# Altium footprint library 04.连接器件.pcb.PCBLIB: 363 footprints (part 3 of 23)
Each footprint in its own frame and in the unit in brackets; x right, y up, seen from the top. Pads: shape width x height; smd on the part's side, far side on the other; paste and mask are expansions set on the pad; w line width, h text height; cw(c..) or ccw(c..) is an arc to the next point about the centre after c.
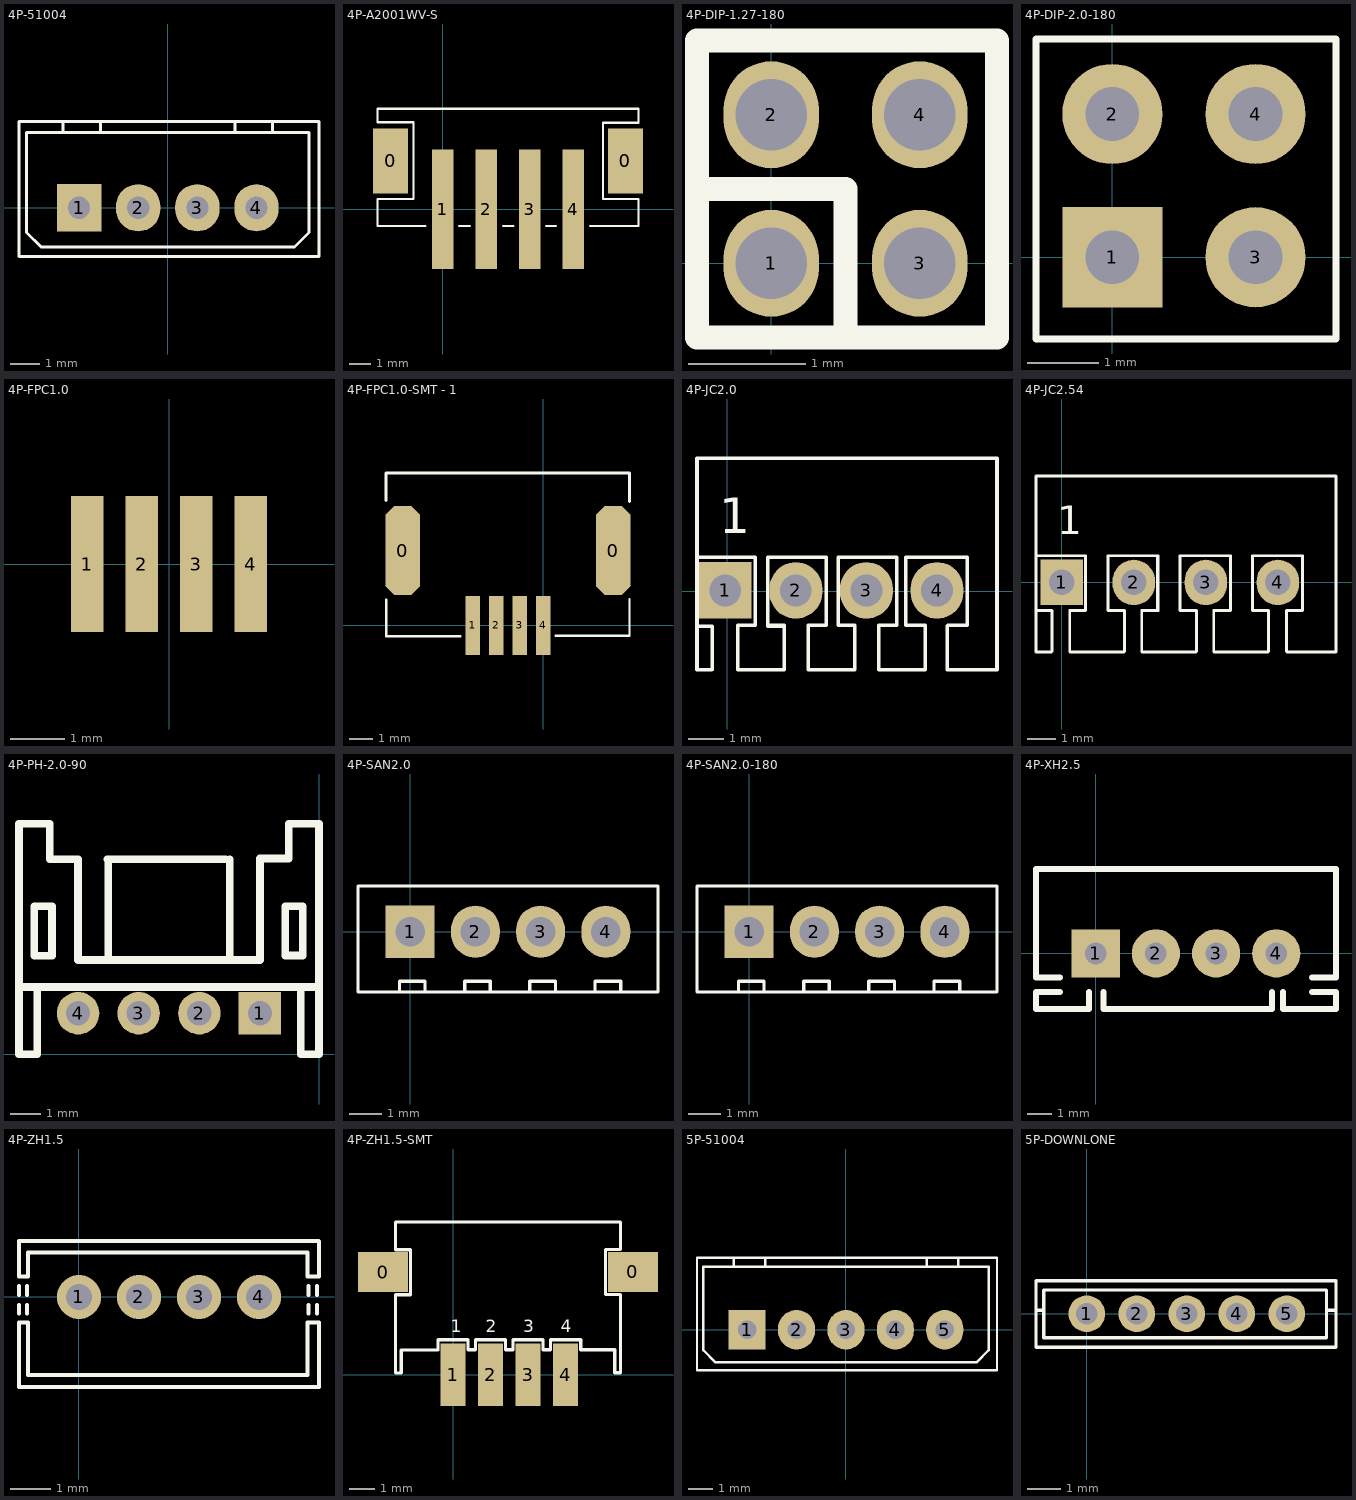
[diagram p2: the footprints below, top view; thin cyan lines are the x and y axes]

## 4P-51004 [mm]
pads (4):
  rect 1.5x1.6 hole 0.75: 1(-3,0)
  oval 1.5x1.6 hole 0.75: 2(-1,0) 3(1,0) 4(3,0)
TopOverlay:
  lines w0.1: -3.54,2.54 -3.54,2.921 ; -2.27,2.54 -2.27,2.921 ; 2.27,2.54 2.27,2.921 ; 3.54,2.54 3.54,2.921 ; -5.032,-1.651 -5.032,2.921 5.115,2.921 5.115,-1.651 -5.032,-1.651 ; -4.774,-0.833 -4.282,-1.325 4.282,-1.325 4.774,-0.833 4.774,2.54 -4.774,2.54 -4.774,-0.833
3D body "510004-4.STEP": height 5.9, standoff -3.47, extent -4.933,-1.549 5.067,2.851

## 4P-A2001WV-S [mm]
pads (6):
  rect 1.6x3 smd: 0(-2.4,2.235) 0(8.4,2.235)
  rect 1x5.5 smd: 1(0,0) 2(2,0) 3(4,0) 4(6,0)
TopOverlay:
  lines w0.1: -0.81,-0.769 -3,-0.769 -3,0.483 -1.346,0.483 -1.346,4.013 -3,4.013 -3,4.631 9,4.631 9,3.988 7.366,3.988 7.366,0.483 9,0.483 9,-0.769 6.785,-0.769 ; 0.739,-0.769 1.247,-0.769 ; 2.771,-0.769 3.254,-0.769 ; 4.753,-0.769 5.21,-0.769
3D body "A2001WV-4.STEP": height 5.9, standoff -0.25, extent -2.974,-2.765 9.026,4.665

## 4P-DIP-1.27-180 [mil]
pads (4):
  oval 32x36 hole 24: 1(0,0) 2(0,50) 3(50,0) 4(50,50)
TopOverlay:
  lines w8: -25,25 25,25 25,-25 ; -25,-25 -25,75 76,75 76,-25 -25,-25

## 4P-DIP-2.0-180 [mm] "插针"
pads (4):
  rect 1.4x1.4 hole 0.75: 1(0,0)
  round 1.4 hole 0.75: 2(0,2) 3(2,0) 4(2,2)
TopOverlay:
  lines w0.1: -1.067,-1.143 -1.067,3.048 3.124,3.048 3.124,-1.143 -1.067,-1.143
3D body "DIP4(2.0)排针.": height 8, standoff -2.6, extent -0.991,-1.041 3.009,2.959

## 4P-FPC1.0 [mm]
pads (4):
  rect 0.6x2.5 smd: 1(-1.5,0) 2(-0.5,0) 3(0.5,0) 4(1.5,0)
3D body: height 1.2, standoff 0, extent 1.295,1.027 1.698,1.11
3D body: height 1.2, standoff 0, extent 0.295,1.027 0.698,1.11
3D body: height 1.2, standoff 0, extent -0.704,1.028 -0.302,1.111
3D body: height 1.2, standoff 0, extent -1.704,1.028 -1.302,1.111

## 4P-FPC1.0-SMT - 1 [mm]
height 2.7
pads (6):
  oct 1.47x3.8 smd: 0(-5.985,3.186) 0(2.985,3.186)
  rect 0.6x2.5 smd: 1(-3,0) 2(-2,0) 3(-1,0) 4(0,0)
TopOverlay:
  lines w0.1: -6.687,1.103 -6.687,-0.457 -3.537,-0.457 ; 0.522,-0.439 3.671,-0.439 3.671,1.11
  lines w0.127: -6.687,5.319 -6.687,6.481 3.675,6.481 3.675,5.283
3D body: height 2.1, standoff 0, extent 1.851,5.302 3.407,6.481
3D body: height 2.1, standoff 0, extent -6.366,5.302 -4.81,6.481
3D body: height 1.2, standoff 0, extent -0.205,1.027 0.198,1.11
3D body: height 1.2, standoff 0, extent -1.205,1.027 -0.802,1.11
3D body: height 1.2, standoff 0, extent -2.204,1.028 -1.802,1.111
3D body: height 1.2, standoff 0, extent -3.204,1.028 -2.802,1.111
3D body: height 0.2, standoff 0, extent -0.205,-0.45 0.198,1.111
3D body: height 0.2, standoff 0, extent -1.205,-0.45 -0.802,1.111
3D body: height 0.2, standoff 0, extent -2.205,-0.45 -1.802,1.111
3D body: height 0.2, standoff 0, extent -3.205,-0.45 -2.802,1.111
3D body: height 2, standoff 0, extent -5.985,1.11 2.985,6.481

## 4P-JC2.0 [mm]
pads (4):
  rect 1.5x1.6 hole 0.9: 1(-0.056,0.025)
  oval 1.5x1.6 hole 0.9: 2(1.944,0.025) 3(3.944,0.025) 4(5.944,0.025)
TopOverlay:
  lines w0.1: -0.856,-0.991 -0.419,-0.991 -0.419,-2.21 -0.433,-2.225 -0.856,-2.225 -0.856,0.965 ; 1.144,-0.991 1.581,-0.991 ; 3.567,-2.225 3.581,-2.21 ; 6.233,-0.98 6.233,-2.225 7.644,-2.225 7.644,3.775 -0.856,3.775 -0.856,0.965 ; 6.248,-0.965 6.807,-0.965 6.807,0.965 5.055,0.965 5.055,-0.965 5.613,-0.965 5.613,-2.225 4.293,-2.225 4.293,-0.965 4.801,-0.965 4.801,0.965 3.144,0.965 3.144,-0.965 3.613,-0.965 3.613,-2.225 2.293,-2.225 2.293,-0.965 2.801,-0.965 2.801,0.965 1.144,0.965 1.144,-0.965 1.613,-0.965 1.613,-2.225 0.293,-2.225 0.293,-0.965 0.801,-0.965 0.801,0.965 -0.856,0.965 ; 1.567,-2.225 1.581,-2.21 1.567,-2.225
  text "1" at -0.229,1.651 h1
3D body "4P-JC2.0.STEP": height 3.4, standoff -3.22, extent -1.321,-7.163 7.179,3.837

## 4P-JC2.54 [mm]
pads (4):
  rect 1.5x1.6 hole 0.9: 1(0,0)
  oval 1.5x1.6 hole 0.9: 2(2.54,0) 3(5.08,0) 4(7.62,0)
TopOverlay:
  lines w0.1: -0.91,-0.991 -0.351,-0.991 -0.351,-2.436 -0.365,-2.45 -0.91,-2.45 -0.91,0.94 ; 0.838,0.935 0.838,-0.991 0.279,-0.991 0.279,-2.436 0.293,-2.45 0.838,-2.45 1.651,-2.45 2.196,-2.45 2.21,-2.436 2.21,-0.991 1.651,-0.991 ; 0.843,0.94 -0.91,0.94 ; 2.189,-0.991 1.63,-0.991 1.63,0.94 ; 2.845,-2.436 2.859,-2.45 ; 3.378,0.935 3.378,-0.991 ; 3.404,-0.991 3.404,0.94 ; 4.17,-2.45 4.715,-2.45 4.729,-2.436 ; 4.191,-0.991 4.75,-0.991 4.75,-2.436 4.736,-2.45 4.191,-2.45 3.378,-2.45 ; 4.729,-0.991 4.17,-0.991 4.17,0.94 5.923,0.94 ; 5.385,-2.436 5.399,-2.45 ; 5.918,-0.991 5.359,-0.991 5.359,-2.436 5.373,-2.45 5.918,-2.45 6.731,-2.45 7.276,-2.45 7.29,-2.436 7.29,-0.991 6.731,-0.991 6.731,0.94 8.484,0.94 8.484,-0.991 7.925,-0.991 7.925,-2.436 7.939,-2.45 8.484,-2.45 9.67,-2.45 9.67,3.75 -0.91,3.75 -0.91,0.94 ; 5.944,-0.991 5.944,0.94 ; 1.63,0.94 3.383,0.94 1.63,0.94 ; 2.819,-2.436 2.819,-0.991 ; 2.819,-2.436 2.833,-2.45 ; 2.819,-2.436 2.819,-0.991 ; 2.819,-2.436 2.833,-2.45 ; 2.819,-0.991 3.378,-0.991 ; 2.819,-0.991 3.378,-0.991 ; 2.833,-2.45 3.378,-2.45 ; 2.833,-2.45 3.378,-2.45 ; 2.175,-2.45 2.189,-2.436 2.175,-2.45
  text "1" at -0.152,1.702 h1

## 4P-PH-2.0-90 [mm]
pads (4):
  rect 1.4x1.4 hole 0.8: 1(-1.95,1.35)
  round 1.4 hole 0.8: 2(-3.95,1.35) 3(-5.95,1.35) 4(-7.95,1.35)
TopOverlay:
  lines w0.254: -9.9,2.215 0,2.215 ; -9.3,2.215 -9.3,0 -9.9,0 -9.9,7.6 -8.89,7.6 -8.89,6.431 -7.95,6.431 -7.95,3.104 -1.95,3.104 -1.95,6.457 -1,6.457 -1,7.6 0,7.6 0,0 -0.6,0 -0.6,2.215 ; -6.985,6.431 -3.073,6.431 ; -6.95,3.104 -6.95,6.431 ; -2.95,3.104 -2.95,6.431 ; -0.573,2.215 -0.123,2.215 ; -9.398,3.251 -9.398,4.877 -8.814,4.877 -8.814,3.251 -9.398,3.251 ; -1.118,3.256 -0.533,3.256 -0.533,4.882 -1.118,4.882 -1.118,3.256
3D body: height 5, standoff 0, extent -9.9,0 0,7.6

## 4P-SAN2.0 [mm]
pads (4):
  rect 1.5x1.6 hole 0.9: 1(0,0)
  oval 1.5x1.6 hole 0.9: 2(2,0) 3(4,0) 4(6,0)
TopOverlay:
  lines w0.1: -0.33,-1.85 -0.33,-1.524 0.457,-1.524 0.457,-1.85 ; 1.67,-1.85 1.67,-1.524 2.457,-1.524 2.457,-1.85 ; 3.67,-1.85 3.67,-1.524 4.457,-1.524 4.457,-1.85 ; 5.67,-1.85 5.67,-1.524 6.457,-1.524 6.457,-1.85 ; 7.592,-1.85 7.6,-1.842 7.6,1.4 ; 7.595,-1.85 -1.6,-1.85 -1.6,1.4 7.595,1.4
3D body "4P-SAN2.0.STEP": height 11, standoff -3.19, extent -1.6,-1.88 7.6,1.37

## 4P-SAN2.0-180 [mm]
pads (4):
  rect 1.5x1.6 hole 0.9: 1(0,0)
  oval 1.5x1.6 hole 0.9: 2(2,0) 3(4,0) 4(6,0)
TopOverlay:
  lines w0.1: -0.33,-1.85 -0.33,-1.524 0.457,-1.524 0.457,-1.85 ; 1.67,-1.85 1.67,-1.524 2.457,-1.524 2.457,-1.85 ; 3.67,-1.85 3.67,-1.524 4.457,-1.524 4.457,-1.85 ; 5.67,-1.85 5.67,-1.524 6.457,-1.524 6.457,-1.85 ; 7.592,-1.85 7.6,-1.842 7.6,1.4 ; 7.595,-1.85 -1.6,-1.85 -1.6,1.4 7.595,1.4
3D body "4P-SAN2.0.STEP": height 11, standoff -3.19, extent -1.6,-1.88 7.6,1.37

## 4P-XH2.5 [mm]
pads (4):
  rect 2x2 hole 0.9: 1(0,0)
  round 2 hole 0.9: 2(2.5,0) 3(5,0) 4(7.5,0)
TopOverlay:
  lines w0.254: -1.48,-1.6 -2.48,-1.6 -2.48,-2.3 -0.58,-2.3 ; -1.48,-1 -2.48,-1 -2.48,3.5 9.98,3.5 9.98,-1 8.98,-1 ; -0.88,-2.3 -0.28,-2.3 -0.28,-1.6 ; 0.32,-1.6 0.32,-2.3 0.62,-2.3 3.82,-2.3 7.02,-2.3 ; 6.72,-2.3 7.32,-2.3 7.32,-1.6 ; 7.78,-1.6 7.78,-2.3 8.38,-2.3 ; 8.08,-2.3 9.98,-2.3 9.98,-1.6 8.98,-1.6
3D body "4PIN-XH2.5.STEP": height 5.9, standoff -3.47, extent -2.438,-2.245 9.962,3.505

## 4P-ZH1.5 [mm]
pads (4):
  round 1.1 hole 0.65: 1(0,0) 2(1.5,0) 3(3,0) 4(4.5,0)
TopOverlay:
  lines w0.1: -1.499,-0.406 -1.499,-0.203 ; -1.499,0.051 -1.499,0.279 ; -1.295,-0.406 -1.295,-0.203 ; -1.295,0.051 -1.295,0.279 ; 5.715,-1.956 -1.27,-1.956 -1.27,-0.635 -1.5,-0.635 -1.5,-2.25 6,-2.25 6,-0.682 ; 5.715,1.118 -1.27,1.118 -1.27,0.508 -1.5,0.508 -1.5,1.4 5.991,1.4 6,1.391 6,0.508 5.716,0.508 5.716,1.118 ; 5.716,-1.956 5.716,-0.635 6,-0.635 ; 5.742,-0.406 5.742,-0.203 ; 5.742,0.051 5.742,0.279 ; 5.945,-0.406 5.945,-0.203 ; 5.945,0.051 5.945,0.279
3D body "4P-ZH1.5.STEP": height 4.6, standoff -2.45, extent -1.473,-2.235 6.027,1.415

## 4P-ZH1.5-SMT [mm]
pads (6):
  rect 2x1.6 smd: 0(-2.8,4.1) 0(7.19,4.11)
  rect 1x2.5 smd: 1(0,0) 2(1.5,0) 3(3,0) 4(4.5,0)
TopOverlay:
  lines w0.127: -2.3,6.1 -2.3,5 -1.7,5 -1.7,3.2 -2.3,3.2 -2.3,0.07 -2.07,0.07 -2.07,0.99 -0.61,0.99 -0.6,1 -0.6,1.4 0.6,1.4 0.6,1 0.9,1 0.9,1.4 2.1,1.4 2.1,1 2.4,1 2.4,1.4 3.6,1.4 3.6,1 3.9,1 3.9,1.4 5.1,1.4 5.1,1 ; -2.29,6.11 6.69,6.11 6.69,5.01 6.09,5.01 6.09,3.21 6.69,3.21 6.69,0.08 6.46,0.08 6.46,1 5.1,1 ; 5.09,1.01 5.1,1
  text "4" at 4.3,1.7 h0.5
  text "3" at 2.8,1.7 h0.5
  text "2" at 1.3,1.7 h0.5
  text "1" at -0.1,1.7 h0.5
3D body "4P-ZH1.5-SMT.STEP": height 3.7, standoff -0.25, extent -2.311,-0.432 6.689,6.068

## 5P-51004 [mm]
pads (5):
  rect 1.5x1.6 hole 0.75: 1(-4,0)
  oval 1.5x1.6 hole 0.75: 2(-2,0) 3(0,0) 4(2,0) 5(4,0)
TopOverlay:
  lines w0.1: -4.54,2.54 -4.54,2.921 ; -3.27,2.54 -3.27,2.921 ; 3.27,2.54 3.27,2.921 ; 4.54,2.54 4.54,2.921 ; -6.032,-1.651 6.115,-1.651 6.115,2.921 -6.032,2.921 -6.032,-1.651 ; -5.774,-0.833 -5.282,-1.325 1,-1.325 5.282,-1.325 5.774,-0.833 5.774,2.54 -5.774,2.54 -5.774,-0.833
3D body "510004-5.STEP": height 5.9, standoff -3.47, extent -5.949,-1.555 6.051,2.845

## 5P-DOWNLONE [mm]
pads (5):
  round 1.1 hole 0.65: 1(0,0) 2(1.5,0) 3(3,0) 4(4.5,0) 5(6,0)
TopOverlay:
  lines w0.1: -1.524,0.103 -1.294,0.103 ; -1.524,0.103 -1.524,0.995 7.468,0.995 7.476,0.987 7.476,0.103 ; -1.524,0.103 -1.524,-1.008 7.476,-1.008 7.476,0.103 ; -1.294,0.103 -1.294,0.713 7.193,0.713 7.193,0.103 ; -1.294,0.103 -1.294,-0.722 7.193,-0.722 7.193,0.103 ; 7.193,0.103 7.476,0.103